# Altium footprint library DrPCB.PcbLib: 910 footprints (part 28 of 57)
Each footprint in its own frame and in the unit in brackets; x right, y up, seen from the top. Pads: shape width x height; smd on the part's side, far side on the other; paste and mask are expansions set on the pad; w line width, h text height; cw(c..) or ccw(c..) is an arc to the next point about the centre after c.
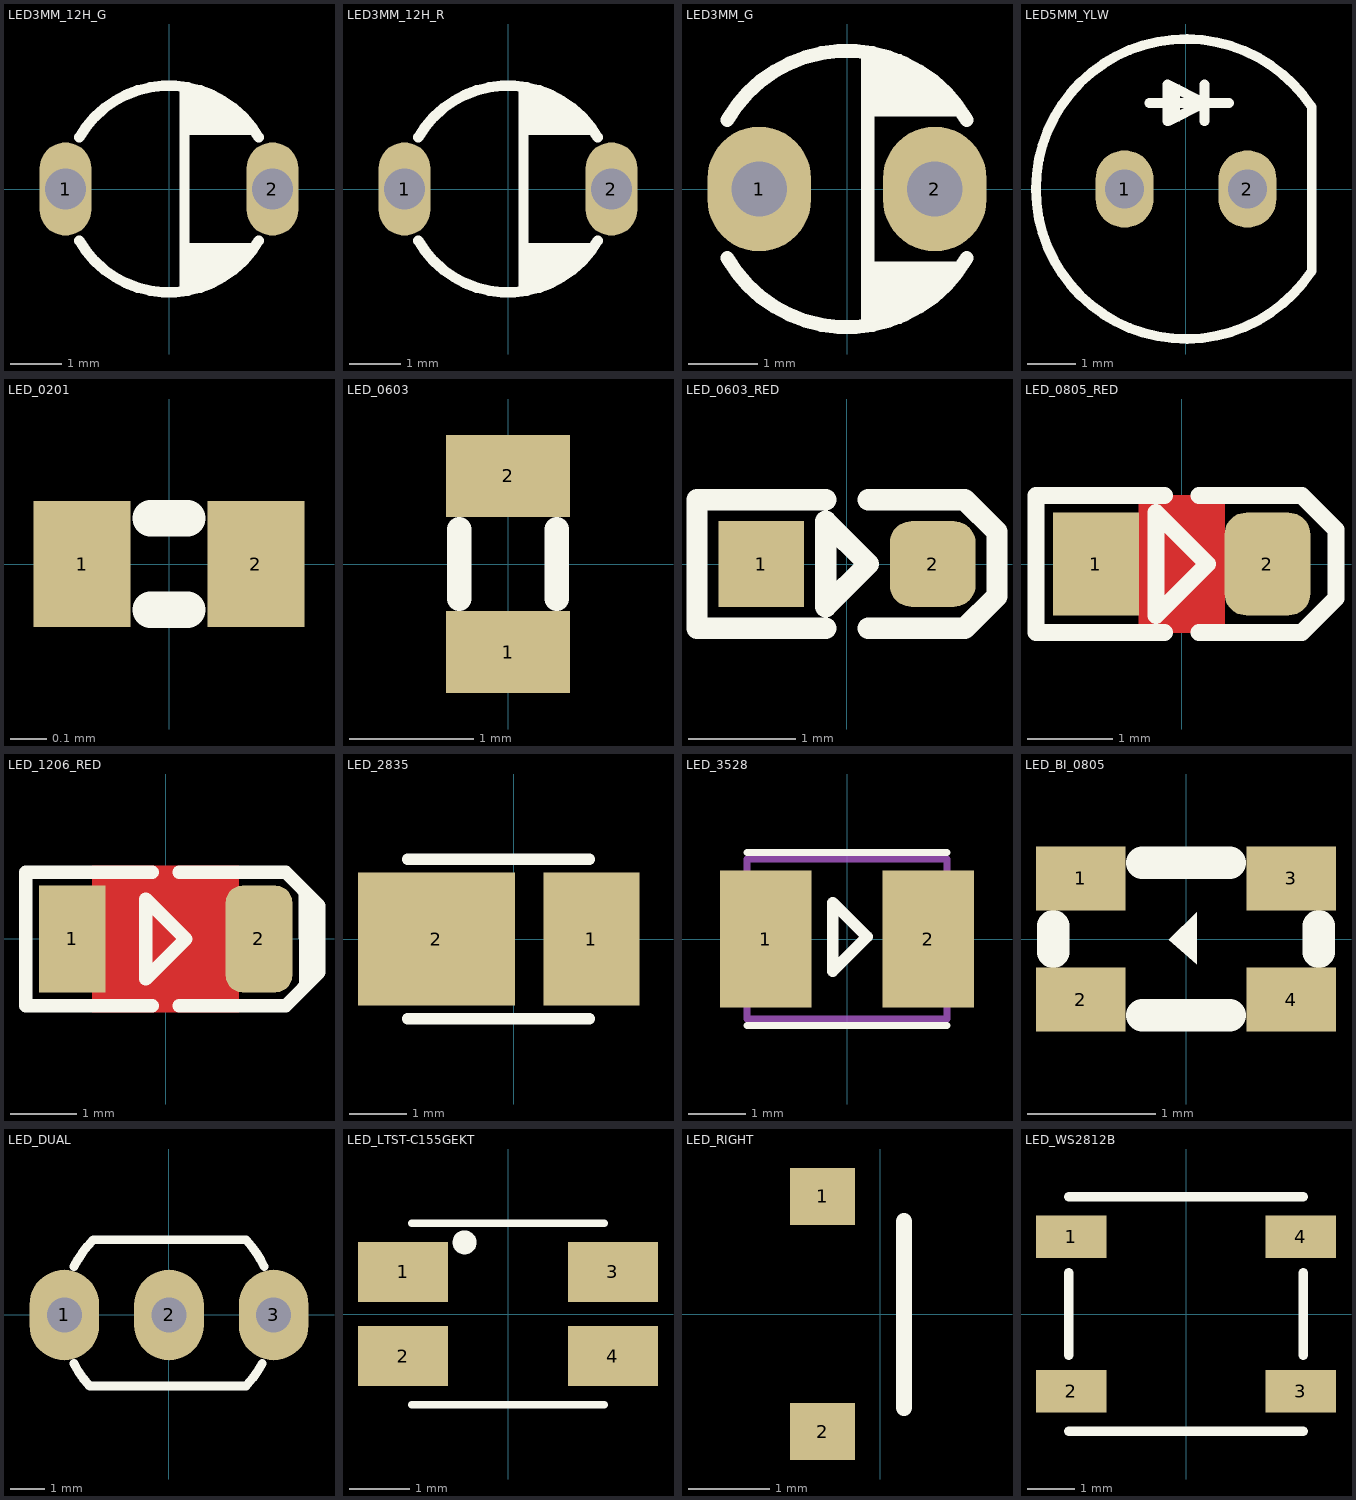
[diagram p27: the footprints below, top view; thin cyan lines are the x and y axes]

## LED3MM_12H_G [mm] "LED THD 3MM"
pads (2):
  oval 1x1.8 hole 0.8: 1(-2,0) 2(2,0)
Top Overlay:
  region: 0.3,1.95 0.3,1.05 1.682,1.05 0.782,1.95
  region: 0.3,-1.95 0.3,-1.05 1.682,-1.05 0.782,-1.95
  lines w0.2: -1.732,-1 ccw(c0,0) 1.732,-1 ; -1.732,1 cw(c0,0) 1.732,1 ; 0.3,-1.95 0.3,1.95
3D body "LED 3mm Green.step": height 12.61, standoff 0.01, extent -1.925,-1.924 1.65,1.924

## LED3MM_12H_R [mm] "LED THD 3MM"
pads (2):
  oval 1x1.8 hole 0.8: 1(-2,0) 2(2,0)
Top Overlay:
  region: 0.3,-1.95 0.3,-1.05 1.682,-1.05 0.782,-1.95
  region: 0.3,1.95 0.3,1.05 1.682,1.05 0.782,1.95
  lines w0.2: -1.732,-1 ccw(c0,0) 1.732,-1 ; -1.732,1 cw(c0,0) 1.732,1 ; 0.3,-1.95 0.3,1.95
3D body "LED 3mm Red.step": height 12.61, standoff 0.01, extent -1.925,-1.924 1.65,1.924

## LED3MM_G [mm] "LED THD 3MM"
pads (2):
  oval 1.5x1.8 hole 0.8: 1(-1.27,0) 2(1.27,0)
Top Overlay:
  region: 0.3,-1.95 0.3,-1.05 1.682,-1.05 0.782,-1.95
  region: 0.3,1.95 0.3,1.05 1.682,1.05 0.782,1.95
  lines w0.2: -1.732,-1 ccw(c0,0) 1.732,-1 ; -1.732,1 cw(c0,0) 1.732,1 ; 0.3,-1.95 0.3,1.95
3D body "CircuitWorks-LED DIP 3MM.step": height 6.5, standoff -2, extent -1.9,-1.9 1.6,1.9

## LED5MM_YLW [mm] "LED THD 5MM YELLOW"
pads (2):
  oval 1.2x1.6 hole 0.8: 1(-1.27,0) 2(1.27,0)
Top Overlay:
  rectangle: -0.381,1.397 -0.127,2.159
  lines w0.2: -0.762,1.778 0.889,1.778 ; 0.381,1.397 0.381,2.159 ; 2.6,-1.7 2.6,1.7 ; 2.6,-1.688 cw(c0,0) 2.6,1.688 ; -0.381,1.397 0.381,1.778 -0.381,2.159 -0.381,1.397
3D body "LED-D5Y.step": height 9.14, standoff -6.3, extent -3,-3 2.5,3

## LED_0201 [mm]
pads (2):
  rect 0.27x0.35 smd mask+0.05: 1(-0.241,0) 2(0.241,0)
Top Overlay:
  lines w0.1: -0.051,-0.127 0.051,-0.127 ; -0.051,0.127 0.051,0.127
3D body: height 0.2, standoff 0, extent -0.324,-0.178 0.324,0.178

## LED_0603 [mm]
pads (2):
  rect 1x0.66 smd: 1(0,-0.71) 2(0,0.71)
Top Overlay:
  lines w0.2: -0.394,-0.279 -0.394,0.279 ; 0.394,-0.279 0.394,0.279
3D body "User Library-LED 0603.step": height 0.71, standoff 0.01, extent -0.4,-0.8 0.4,0.8

## LED_0603_RED [mm] "LED SMD 0603, RED"
pads (2):
  rect 0.8x0.8 smd paste-5 mask+0.075: 1(-0.8,0)
  rrect50% 0.8x0.8 smd paste-5 mask+0.075: 2(0.8,0)
Top Overlay:
  lines w0.2: -0.2,-0.6 -1.4,-0.6 -1.4,0.6 -0.2,0.6 ; 0.2,-0.6 1.1,-0.6 1.4,-0.3 1.4,0.3 1.1,0.6 0.2,0.6 ; -0.2,-0.4 -0.2,0.4 0.2,0 -0.2,-0.4
Top Paste:
  region: 0.75,0.35 0.68,0.35 0.552,0.297 0.453,0.198 0.4,0.07 0.4,0 0.4,-0.07 0.453,-0.198 0.552,-0.297 0.68,-0.35 0.75,-0.35 0.95,-0.35 0.98,-0.35 1.035,-0.327 1.077,-0.285 1.1,-0.23 1.1,-0.2 1.1,0.2 1.1,0.23 1.077,0.285 1.035,0.327 0.98,0.35 0.95,0.35
  region: -0.75,0.35 -0.68,0.35 -0.552,0.297 -0.453,0.198 -0.4,0.07 -0.4,0 -0.4,-0.07 -0.453,-0.198 -0.552,-0.297 -0.68,-0.35 -0.75,-0.35 -0.95,-0.35 -0.98,-0.35 -1.035,-0.327 -1.077,-0.285 -1.1,-0.23 -1.1,-0.2 -1.1,0.2 -1.1,0.23 -1.077,0.285 -1.035,0.327 -0.98,0.35 -0.95,0.35
3D body: height 0.5, standoff 0, extent -0.4,-0.3 0.4,0.3
3D body: height 0.4, standoff 0, extent -0.6,-0.4 0.6,0.4
3D body: height 0.4, standoff 0, extent -0.8,-0.4 -0.6,0.4
3D body: height 0.4, standoff 0, extent 0.6,-0.4 0.8,0.4

## LED_0805_RED [mm] "LED SMD 0805, RED"
height 1.4
pads (2):
  rect 1x1.2 smd paste-2 mask+0.075: 1(-1,0)
  rrect50% 1x1.2 smd paste-2 mask+0.075: 2(1,0)
Top Layer:
  pour cut-out: -0.5,0.8 0.5,0.8 0.5,-0.8 -0.5,-0.8
Top Overlay:
  lines w0.2: -0.2,-0.8 -1.7,-0.8 -1.7,0.8 -0.2,0.8 ; 0.2,-0.8 1.4,-0.8 1.8,-0.4 1.8,0.4 1.4,0.8 0.2,0.8 ; -0.3,-0.6 0.3,0 -0.3,0.6 -0.3,-0.6
Top Paste:
  region: -1,0.5 -0.92,0.5 -0.773,0.439 -0.661,0.327 -0.6,0.18 -0.6,0.1 -0.6,-0.1 -0.6,-0.18 -0.661,-0.327 -0.773,-0.439 -0.92,-0.5 -1,-0.5 -1.25,-0.5 -1.28,-0.5 -1.335,-0.477 -1.377,-0.435 -1.4,-0.38 -1.4,-0.35 -1.4,0.35 -1.4,0.38 -1.377,0.435 -1.335,0.477 -1.28,0.5 -1.25,0.5
  region: 1,0.5 0.92,0.5 0.773,0.439 0.661,0.327 0.6,0.18 0.6,0.1 0.6,-0.1 0.6,-0.18 0.661,-0.327 0.773,-0.439 0.92,-0.5 1,-0.5 1.25,-0.5 1.28,-0.5 1.335,-0.477 1.377,-0.435 1.4,-0.38 1.4,-0.35 1.4,0.35 1.4,0.38 1.377,0.435 1.335,0.477 1.28,0.5 1.25,0.5
3D body "User Library-Wurth Elektronik WL-SMCW 0805 (2012) LED Lens (Separate Body).step": height 0.7, standoff 0.3, extent -0.7,-0.625 0.7,0.625
3D body "User Library-Wurth Elektronik WL-SMCW 0805 (2012) LED Base (Separate Lens).step": height 0.64, standoff 0, extent -1,-0.625 1,0.625

## LED_1206_RED [mm] "LED, 1206, RED"
pads (2):
  rect 1x1.6 smd paste-0.2 mask+0.075: 1(-1.4,0)
  rrect50% 1x1.6 smd paste-0.2 mask+0.075: 2(1.4,0)
Top Layer:
  pour cut-out: -1.1,1.1 -1.1,-1.1 1.1,-1.1 1.1,1.1
Top Overlay:
  region: 2,0.7 2,-0.7 2.3,-0.4 2.3,0.4
  lines w0.2: -0.2,-1 -2.1,-1 -2.1,1 -0.2,1 ; 0.2,-1 1.8,-1 2.3,-0.5 2.3,0.5 1.8,1 0.2,1 ; -0.3,-0.6 -0.3,0.6 0.3,0 -0.3,-0.6
3D body "User Library-Wurth Elektronik WL-SMCW 1206 (3216) LED Base (Separate Lens).step": height 0.62, standoff 0, extent -1.6,-0.8 1.6,0.8
3D body "User Library-Wurth Elektronik WL-SMCW 1206 (3216) LED Lens (Separate Body).step": height 0.68, standoff 0.28, extent -1,-0.8 1,0.8

## LED_2835 [mm]
pads (2):
  rect 1.69x2.34 smd: 1(1.362,0)
  rect 2.76x2.34 smd: 2(-1.362,0)
Top Overlay:
  lines w0.2: -1.873,-1.4 1.327,-1.4 ; -1.873,1.4 1.327,1.4
3D body "User Library-LED 2835.step": height 0.72, standoff 0, extent -2.029,-1.4 1.483,1.4

## LED_3528 [mm]
pads (2):
  rect 1.6x2.4 smd: 1(-1.425,0) 2(1.425,0)
Top Overlay:
  lines w0.127: -1.75,-1.513 1.75,-1.513 ; -1.75,1.513 1.75,1.513
  lines w0.2: -0.249,-0.562 -0.249,0.638 0.351,0.038 -0.249,-0.562
Mechanical 13:
  lines w0.127: -1.75,-1.4 1.75,-1.4 1.75,1.4 -1.75,1.4 -1.75,-1.4
3D body "step_temp.STEP": height 1.9, standoff 0, extent -1.75,-1.4 1.75,1.4

## LED_BI_0805 [mm]
pads (4):
  rect 0.7x0.5 smd: 1(-0.825,0.475) 2(-0.825,-0.475) 3(0.825,0.475) 4(0.825,-0.475)
Top Overlay:
  region: 0.083,-0.197 0.083,0.21 -0.133,-0.006
  lines w0.254: -1.041,-0.102 -1.041,0.102 ; -0.343,-0.597 0.343,-0.597 ; -0.343,0.597 0.343,0.597 ; 1.041,-0.102 1.041,0.102
3D body "User Library-shuangsedeng15.STEP": height 1.01, standoff 0.01, extent -0.999,-0.598 1,0.598

## LED_DUAL [mm]
pads (3):
  oval 2x2.6 hole 1: 1(-3,0) 2(0,0) 3(3,0)
Top Overlay:
  lines w0.254: -2.724,-1.39 ccw(c0,0) -2.299,-2.017 ; -2.723,1.392 cw(c0,0) -2.169,2.157 ; -2.264,-2.032 2.202,-2.032 ; -2.146,2.159 2.186,2.159 ; 2.212,2.145 cw(c-0.023,0.057) 2.732,1.386 ; 2.241,-2 ccw(c-0.023,0.057) 2.672,-1.39

## LED_LTST-C155GEKT [mm]
pads (4):
  rect 1.5x1 smd: 1(-1.75,0.7) 2(-1.75,-0.7) 3(1.75,0.7) 4(1.75,-0.7)
Top Overlay:
  circle w0.2: c-0.724,1.194 r0.1
  lines w0.127: -1.6,-1.514 1.6,-1.514 ; -1.6,1.514 1.6,1.514
3D body "step_temp.STEP": height 1.1, standoff 0, extent -1.6,-1.35 1.6,1.35

## LED_RIGHT [mm]
pads (2):
  rect 0.8x0.7 smd: 1(-0.711,1.45) 2(-0.711,-1.45)
Top Overlay:
  lines w0.2: 0.292,-1.157 0.292,1.143
3D body: height 1.3, standoff 0, extent 2.451,-0.406 2.451,-0.406
3D body "User Library-Osram Duris E3.step": height 1.51, standoff 0.01, extent -1.107,-1.546 0.193,1.547

## LED_WS2812B [mm]
pads (4):
  rect 1.5x0.9 smd: 1(-2.45,1.65) 2(-2.45,-1.65) 3(2.45,-1.65) 4(2.45,1.65)
Top Overlay:
  lines w0.2: -2.5,-2.5 2.5,-2.5 ; -2.5,-0.876 -2.5,0.876 ; -2.5,2.5 2.5,2.5 ; 2.5,-0.876 2.5,0.876
3D body "User Library-ws2812B-1.step": height 1.58, standoff 0.01, extent -2.7,-2.5 2.7,2.5